# Altium footprint library Intelliclone.PcbLib: 372 footprints (part 4 of 24)
Each footprint in its own frame and in the unit in brackets; x right, y up, seen from the top. Pads: shape width x height; smd on the part's side, far side on the other; paste and mask are expansions set on the pad; w line width, h text height; cw(c..) or ccw(c..) is an arc to the next point about the centre after c.
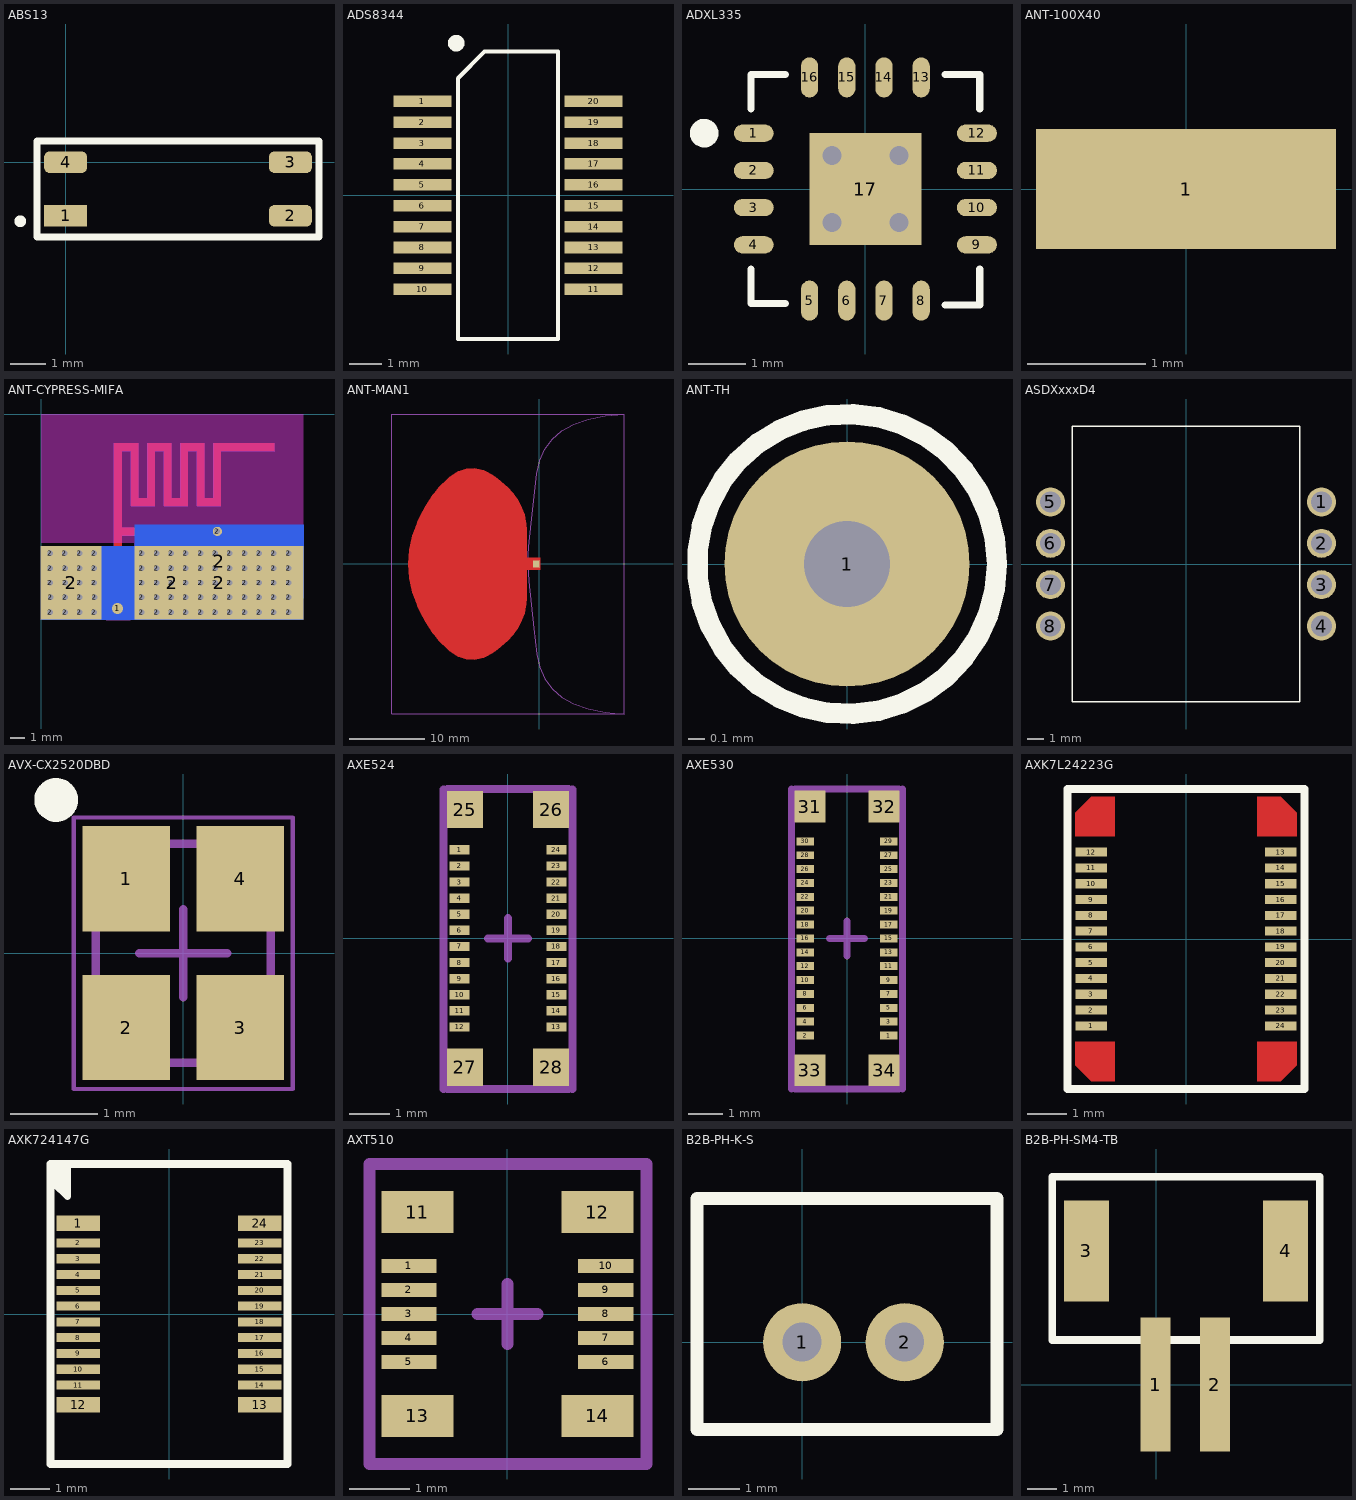
[diagram p3: the footprints below, top view; thin cyan lines are the x and y axes]

## ABS13 [mm]
pads (4):
  rect 1.2x0.6 smd: 1(0,-1.5)
  rrect50% 1.2x0.6 smd: 2(6.3,-1.5) 3(6.3,0) 4(0,0)
Top Overlay:
  circle w0.254: c-1.27,-1.651 r0.036
  lines w0.2: -0.8,-2.1 7.1,-2.1 7.1,0.6 -0.8,0.6 -0.8,-2.1
3D body: height 1.3, standoff 0.1, extent -0.356,-1.513 6.655,-0.113

## ADS8344 [mm]
height 2.54
pads (20):
  rect 1.75x0.35 smd: 1(-2.6,2.857) 2(-2.6,2.222) 3(-2.6,1.587) 4(-2.6,0.953) 5(-2.6,0.318) 6(-2.6,-0.318) 7(-2.6,-0.953) 8(-2.6,-1.587) 9(-2.6,-2.222) 10(-2.6,-2.857) 11(2.6,-2.857) 12(2.6,-2.222) 13(2.6,-1.587) 14(2.6,-0.953) 15(2.6,-0.318) 16(2.6,0.318) 17(2.6,0.953) 18(2.6,1.587) 19(2.6,2.222) 20(2.6,2.857)
Top Overlay:
  circle w0.254: c-1.575,4.623 r0.127
  lines w0.127: -1.524,-4.369 1.524,-4.369 1.524,4.369 -0.711,4.369 -1.524,3.556 -1.524,-4.369
3D body: height 1.73, standoff 0.1, extent -3.099,-4.369 3.099,4.369

## ADXL335 [mm]
height 1.35
pads (17):
  oval 0.7x0.3 smd: 1(-1.95,0.975) 2(-1.95,0.325) 3(-1.95,-0.325) 4(-1.95,-0.975) 9(1.95,-0.975) 10(1.95,-0.325) 11(1.95,0.325) 12(1.95,0.975)
  oval 0.3x0.7 smd: 5(-0.975,-1.95) 6(-0.325,-1.95) 7(0.325,-1.95) 8(0.975,-1.95) 13(0.975,1.95) 14(0.325,1.95) 15(-0.325,1.95) 16(-0.975,1.95)
  rect 1.956x1.956 smd: 17(0,0)
via -0.584,0.584 diameter 0.686 hole 0.33
via -0.584,-0.584 diameter 0.686 hole 0.33
via 0.584,-0.584 diameter 0.686 hole 0.33
via 0.584,0.584 diameter 0.686 hole 0.33
Top Overlay:
  circle w0.25: c-2.817,0.975 r0.125
  lines w0.127: -2,-1.397 -2,-2 -1.397,-2 ; -2,1.397 -2,2 -1.397,2 ; 1.397,-2.025 2,-2.025 2,-1.397 ; 1.397,2 2,2 2,1.397
3D body: height 1.42, standoff 0.1, extent -2.007,-2.007 2.007,2.007

## ANT-100X40 [mil] "Antenna solder pad 100mil x 40 mil"
pads (1):
  rect 100x40 smd: 1(0,0)

## ANT-CYPRESS-MIFA [mil] "FR4 2.5 GHz Narrowband Antenna"
pads (81):
  round 30 smd paste-10000 mask+4: 1(208.27,-529.92)
  round 25 hole 15: 2(25.5,-540) 2(25.5,-460) 2(25.5,-420) 2(25.5,-380) 2(25.67,-500) 2(64.96,-379.92) 2(65.5,-540) 2(65.5,-460) 2(65.5,-420) 2(65.67,-500) 2(105.5,-540) 2(105.5,-460) 2(105.5,-420) 2(105.5,-380) 2(105.67,-500) 2(145.5,-540) 2(145.5,-460) 2(145.5,-420) 2(145.5,-380) 2(145.67,-500) 2(274.5,-540) 2(274.5,-500) 2(274.5,-460) 2(274.5,-420) 2(274.5,-380) 2(314.5,-540) 2(314.5,-500) 2(314.5,-460) 2(314.5,-420) 2(314.5,-380) 2(354.5,-540) 2(354.5,-500) 2(354.5,-460) 2(354.5,-420) 2(354.5,-380) 2(394.5,-540) 2(394.5,-500) 2(394.5,-460) 2(394.5,-420) 2(394.5,-380) 2(434.5,-540) 2(434.5,-500) 2(434.5,-460) 2(434.5,-420) 2(434.5,-380) 2(474.5,-540) 2(474.5,-500) 2(474.5,-460) 2(474.5,-420) 2(474.5,-380) 2(480.31,-320) 2(514.5,-540) 2(514.5,-500) 2(514.5,-460) 2(514.5,-420) 2(514.5,-380) 2(554.5,-540) 2(554.5,-500) 2(554.5,-460) 2(554.5,-420) 2(554.5,-380) 2(594.5,-540) 2(594.5,-500) 2(594.5,-460) 2(594.5,-420) 2(594.5,-380) 2(634.5,-540) 2(634.5,-500) 2(634.5,-460) 2(634.5,-420) 2(634.5,-380) 2(674.5,-540) 2(674.5,-500) 2(674.5,-460) 2(674.5,-420) 2(674.5,-380)
  rect 165.51x200 smd paste-10000 mask+4: 2(81.72,-460)
  rect 715x200 smd far side paste-10000 mask+4: 2(357.5,-460)
  rect 460.63x200 smd far side paste-10000 mask+4: 2(485.04,-401.46)
  rect 460.28x200 smd paste-10000 mask+4: 2(485.07,-460)
Top Layer:
  region: 635,-100 490,-100 490,-250 425,-250 425,-100 400,-100 400,-250 335,-250 335,-100 310,-100 310,-250 245,-250 245,-100 220,-100 220,-310 462.62,-310 493,-310 493,-330 462.62,-330 220,-330 220,-360 242.5,-400 242.5,-547.26 177.5,-547.26 177.5,-400 200,-360 200,-80 265,-80 265,-230 290,-230 290,-80 355,-80 355,-230 380,-230 380,-80 445,-80 445,-230 470,-230 470,-80 635,-80
Bottom Layer:
  region: 253.31,-371.22 251.56,-380 253.31,-388.78 258.28,-396.22 263.93,-400 258.28,-403.78 253.31,-411.22 251.56,-420 253.31,-428.78 258.28,-436.22 263.93,-440 258.28,-443.78 253.31,-451.22 251.56,-460 253.31,-468.78 258.28,-476.22 263.93,-480 258.28,-483.78 253.31,-491.22 251.56,-500 253.31,-508.78 258.28,-516.22 263.93,-520 258.28,-523.78 253.31,-531.22 251.56,-540 253,-547.26 167,-547.26 168.44,-540 166.69,-531.22 161.72,-523.78 156.07,-520 161.72,-516.22 166.69,-508.78 168.44,-500 166.69,-491.22 161.72,-483.78 156.07,-480 161.72,-476.22 166.69,-468.78 168.44,-460 166.69,-451.22 161.72,-443.78 156.07,-440 161.72,-436.22 166.69,-428.78 168.44,-420 166.69,-411.22 161.72,-403.78 156.07,-400 161.72,-396.22 166.69,-388.78 168.44,-380 166.69,-371.22 166.35,-370.71 253.65,-370.71
Keep-Out Layer:
  region: 254.5,-300 715,-300 715,-364.17 254.5,-364.17
  region: 0,0 715,0 715,-350.39 0.23,-350.39
Mechanical 15:
  lines w1: 177.5,-560 177.5,-400 200,-360 200,-80 265,-80 265,-230 290,-230 290,-80 355,-80 355,-230 380,-230 380,-80 445,-80 445,-230 470,-230 470,-80 635,-80 635,-100 490,-100 490,-250 425,-250 425,-100 400,-100 400,-250 335,-250 335,-100 310,-100 310,-250 245,-250 245,-100 220,-100 220,-310 493,-310 493,-330 220,-330 220,-360 242.5,-400 242.5,-560 177.5,-560

## ANT-MAN1 [mm] "UWB MAN antenna"
pads (1):
  rect 0.9x0.92 smd paste-0.45: 1(-0.381,0)
Top Layer:
  region: 0.127,-0.813 -6.99,-0.813 -6.99,0.813 0.127,0.813
  region: -8.317,12.724 -9.687,12.724 -8.551,12.78
  region: -7.408,12.505 -10.324,12.505 -9.687,12.724 -8.317,12.724
  region: -7.087,12.336 -10.818,12.336 -10.324,12.505 -7.408,12.505
  region: -6.26,11.899 -11.5,11.899 -10.818,12.336 -7.087,12.336
  region: -5.876,11.617 -11.941,11.617 -11.5,11.899 -6.26,11.899
  region: -5.182,11.108 -12.483,11.108 -11.941,11.617 -5.876,11.617
  region: -4.577,10.569 -13.057,10.569 -12.483,11.108 -5.182,11.108
  region: -4.247,10.275 -13.293,10.275 -13.057,10.569 -4.577,10.569
  region: -3.456,9.4 -13.997,9.4 -13.293,10.275 -4.247,10.275
  region: -3.307,9.189 -14.166,9.189 -13.997,9.4 -3.456,9.4
  region: -2.808,8.483 -14.622,8.483 -14.166,9.189 -3.307,9.189
  region: -2.303,7.523 -15.241,7.523 -14.622,8.483 -2.808,8.483
  region: -2.288,7.48 -15.269,7.48 -15.241,7.523 -2.303,7.523
  region: -1.942,6.522 -15.76,6.522 -15.269,7.48 -2.288,7.48
  region: -1.751,5.606 -16.231,5.606 -15.76,6.522 -1.942,6.522
  region: -1.724,5.48 -16.277,5.48 -16.231,5.606 -1.751,5.606
  region: -1.65,4.396 -16.674,4.396 -16.277,5.48 -1.724,5.48
  region: -1.65,3.732 -16.918,3.732 -16.674,4.396 -1.65,4.396
  region: -1.65,1.857 -17.331,1.857 -16.918,3.732 -1.65,3.732
  region: -1.65,-0.018 -17.469,-0.018 -17.331,1.857 -1.65,1.857
  region: -1.65,-1.893 -17.331,-1.893 -17.469,-0.018 -1.65,-0.018
  region: -1.65,-3.768 -16.918,-3.768 -17.331,-1.893 -1.65,-1.893
  region: -1.65,-4.432 -16.674,-4.432 -16.918,-3.768 -1.65,-3.768
  region: -1.724,-5.516 -16.277,-5.516 -16.674,-4.432 -1.65,-4.432
  region: -1.751,-5.642 -16.231,-5.642 -16.277,-5.516 -1.724,-5.516
  region: -1.942,-6.558 -15.76,-6.558 -16.231,-5.642 -1.751,-5.642
  region: -2.288,-7.516 -15.269,-7.516 -15.76,-6.558 -1.942,-6.558
  region: -2.303,-7.559 -15.241,-7.559 -15.269,-7.516 -2.288,-7.516
  region: -2.808,-8.519 -14.622,-8.519 -15.241,-7.559 -2.303,-7.559
  region: -3.307,-9.225 -14.166,-9.225 -14.622,-8.519 -2.808,-8.519
  region: -3.456,-9.436 -13.997,-9.436 -14.166,-9.225 -3.307,-9.225
  region: -4.247,-10.311 -13.293,-10.311 -13.997,-9.436 -3.456,-9.436
  region: -4.577,-10.605 -13.057,-10.605 -13.293,-10.311 -4.247,-10.311
  region: -5.182,-11.144 -12.483,-11.144 -13.057,-10.605 -4.577,-10.605
  region: -5.876,-11.653 -11.941,-11.653 -12.483,-11.144 -5.182,-11.144
  region: -6.26,-11.935 -11.5,-11.935 -11.941,-11.653 -5.876,-11.653
  region: -7.087,-12.372 -10.818,-12.372 -11.5,-11.935 -6.26,-11.935
  region: -7.408,-12.541 -10.324,-12.541 -10.818,-12.372 -7.087,-12.372
  region: -8.317,-12.76 -9.687,-12.76 -10.324,-12.541 -7.408,-12.541
  region: -8.551,-12.816 -9.687,-12.76 -8.317,-12.76
Mechanical 15:
  lines w0.1: -1.528,-0.018 -1.388,-2.31 -0.686,-8.585 -0.296,-12.054 0.065,-13.81 0.738,-15.35 1.725,-16.674 3.024,-17.78 4.636,-18.669 6.56,-19.339 8.796,-19.794 11.359,-20.032 11.359,19.996 8.796,19.758 6.56,19.303 4.636,18.633 3.024,17.744 1.725,16.638 0.738,15.314 0.065,13.774 -0.296,12.018 -1.022,5.448 -1.388,2.274 -1.528,-0.018
  lines w0.152: -19.654,-20.018 11.346,-20.018 11.346,19.982 -19.654,19.982 -19.654,-20.018

## ANT-TH [mil] "Through hole antenna for .010\" wire and ferrule"
pads (1):
  round 60 hole 21: 1(0,0)
Top Overlay:
  circle w5: c0,0 r36.69

## ASDXxxxD4 [mil]
pads (8):
  round 70 hole 50: 1(327.5,150) 2(327.5,50) 3(327.5,-50) 4(327.5,-150) 5(-327.5,150) 6(-327.5,50) 7(-327.5,-50) 8(-327.5,-150)
Top Overlay:
  lines w4.02: -275,-332.5 275,-332.5 275,332.5 -275,332.5 -275,-332.5
3D body: height 294.65, standoff 205, extent -216.82,-644 -127,-144
3D body: height 139.45, standoff 0, extent -69.86,-644 69.86,-334
3D body: height 250, standoff 1, extent -275,-332 275,332

## AVX-CX2520DBD [mm] "Hand Drawn, 4-Leads,Body 2.5x2mm"
height 0.55
pads (4):
  rect 1x1.2 smd: 1(-0.65,0.85) 2(-0.65,-0.85) 3(0.65,-0.85) 4(0.65,0.85)
Top Overlay:
  circle w0.25: c-1.45,1.75 r0.125
Mechanical 13:
  lines w0.1: -1,-1.25 1,-1.25 1,1.25 -1,1.25 -1,-1.25
Mechanical 15:
  lines w0.05: -1.25,-1.55 1.25,-1.55 1.25,1.55 -1.25,1.55 -1.25,-1.55
  lines w0.1: -0.5,0 0.5,0 ; 0,-0.5 0,0.5
3D body: height 0.55, standoff 0, extent -1,-1.25 1,1.25

## AXE524 [mm] "Panasonic A4S series, 24pin"
pads (28):
  rect 0.5x0.23 smd mask-0.03: 1(-1.2,2.2) 2(-1.2,1.8) 3(-1.2,1.4) 4(-1.2,1) 5(-1.2,0.6) 6(-1.2,0.2) 7(-1.2,-0.2) 8(-1.2,-0.6) 9(-1.2,-1) 10(-1.2,-1.4) 11(-1.2,-1.8) 12(-1.2,-2.2) 13(1.2,-2.2) 14(1.2,-1.8) 15(1.2,-1.4) 16(1.2,-1) 17(1.2,-0.6) 18(1.2,-0.2) 19(1.2,0.2) 20(1.2,0.6) 21(1.2,1) 22(1.2,1.4) 23(1.2,1.8) 24(1.2,2.2)
  rect 0.9x0.92 smd paste-0.35: 25(-1.07,3.2) 26(1.07,3.2) 27(-1.07,-3.2) 28(1.07,-3.2)
Mechanical 16:
  lines w0.2: -1.6,-3.74 -1.6,3.7 ; -1.5,-3.74 1.5,-3.74 ; -1.5,3.71 1.5,3.71 ; -0.5,0 0,0 ; 0,-0.5 0,0 ; 0,0.5 0,0 ; 0.5,0 0,0 ; 1.6,-3.74 1.6,3.7
3D body "axe524124.stp": height 0.77, standoff 0, extent -1.25,-3.65 1.25,3.65

## AXE530 [mm] "Panasonic A4S series, 30 pin"
pads (34):
  rect 0.5x0.23 smd mask-0.03: 1(1.2,-2.8) 2(-1.2,-2.8) 3(1.2,-2.4) 4(-1.2,-2.4) 5(1.2,-2) 6(-1.2,-2) 7(1.2,-1.6) 8(-1.2,-1.6) 9(1.2,-1.2) 10(-1.2,-1.2) 11(1.2,-0.8) 12(-1.2,-0.8) 13(1.2,-0.4) 14(-1.2,-0.4) 15(1.2,0) 16(-1.2,0) 17(1.2,0.4) 18(-1.2,0.4) 19(1.2,0.8) 20(-1.2,0.8) 21(1.2,1.2) 22(-1.2,1.2) 23(1.2,1.6) 24(-1.2,1.6) 25(1.2,2) 26(-1.2,2) 27(1.2,2.4) 28(-1.2,2.4) 29(1.2,2.8) 30(-1.2,2.8)
  rect 0.9x0.92 smd paste-0.35: 31(-1.07,3.8) 32(1.07,3.8) 33(-1.07,-3.8) 34(1.07,-3.8)
Mechanical 16:
  lines w0.2: -1.6,-4.34 -1.6,4.31 ; -1.5,-4.34 1.5,-4.34 ; -1.5,4.31 1.5,4.31 ; -0.5,0 0,0 ; 0,-0.5 0,0 ; 0,0.5 0,0 ; 0.5,0 0,0 ; 1.6,-4.34 1.6,4.31
3D body "axe530127.step": height 0.77, standoff 0, extent -1.225,-4.25 1.275,4.25

## AXK7L24223G [mm] "Panasonic F4 Family Connector Socket 24 pins"
pads (24):
  rect 0.8x0.23 smd: 1(-2.4,-2.2) 2(-2.4,-1.8) 3(-2.4,-1.4) 4(-2.4,-1) 5(-2.4,-0.6) 6(-2.4,-0.2) 7(-2.4,0.2) 8(-2.4,0.6) 9(-2.4,1) 10(-2.4,1.4) 11(-2.4,1.8) 12(-2.4,2.2) 13(2.4,2.2) 14(2.4,1.8) 15(2.4,1.4) 16(2.4,1) 17(2.4,0.6) 18(2.4,0.2) 19(2.4,-0.2) 20(2.4,-0.6) 21(2.4,-1) 22(2.4,-1.4) 23(2.4,-1.8) 24(2.4,-2.2)
Top Layer:
  region: -1.8,3.6 -1.8,2.6 -2.8,2.6 -2.8,3.2 -2.4,3.6
  region: 2.8,2.6 1.8,2.6 1.8,3.6 2.4,3.6 2.8,3.2
  region: 1.8,-3.6 1.8,-2.6 2.8,-2.6 2.8,-3.2 2.4,-3.6
  region: -2.8,-2.6 -1.8,-2.6 -1.8,-3.6 -2.4,-3.6 -2.8,-3.2
Top Overlay:
  lines w0.2: -3,-3.8 -3,3.8 -0.5,3.8 3,3.8 3,-3.8 -3,-3.8
3D body "axk7l24223.step": height 0.87, standoff 0, extent -2.5,-3.6 2.5,3.6

## AXK724147G [mm] "Panasonic P4 Family Connector Socket 24 pins"
height 1.31
pads (24):
  rect 1.1x0.4 smd: 1(-2.3,2.3) 12(-2.3,-2.3) 13(2.3,-2.3) 24(2.3,2.3)
  rect 1.1x0.23 smd: 2(-2.3,1.8) 3(-2.3,1.4) 4(-2.3,1) 5(-2.3,0.6) 6(-2.3,0.2) 7(-2.3,-0.2) 8(-2.3,-0.6) 9(-2.3,-1) 10(-2.3,-1.4) 11(-2.3,-1.8) 14(2.3,-1.8) 15(2.3,-1.4) 16(2.3,-1) 17(2.3,-0.6) 18(2.3,-0.2) 19(2.3,0.2) 20(2.3,0.6) 21(2.3,1) 22(2.3,1.4) 23(2.3,1.8)
Top Overlay:
  lines w0.076: -3,3.8 -2.57,3.8 ; -2.95,2.6 -2.95,2.63
  lines w0.178: -2.881,3.753 -2.881,3.286 -2.57,2.975 -2.57,3.8 ; -2.741,3.184 -2.741,3.784
  lines w0.2: -3,-3.8 3,-3.8 3,3.8 -0.5,3.8 -3,3.8 -3,-3.8
3D body "axk724147.stp": height 1.5, standoff 0, extent -2.55,-3.55 2.55,3.55

## AXT510 [mm] "Panasonic F4S series, 10pin"
pads (14):
  rect 0.92x0.23 smd mask-0.03: 1(-1.64,0.8) 2(-1.64,0.4) 3(-1.64,0) 4(-1.64,-0.4) 5(-1.64,-0.8) 6(1.64,-0.8) 7(1.64,-0.4) 8(1.64,0) 9(1.64,0.4) 10(1.64,0.8)
  rect 1.2x0.7 smd paste-0.35: 11(-1.5,1.7) 12(1.5,1.7) 13(-1.5,-1.7) 14(1.5,-1.7)
Mechanical 16:
  lines w0.2: -0.5,0 0,0 ; 0,-0.5 0,0 ; 0,0.5 0,0 ; 0.5,0 0,0 ; -2.3,-2.5 -2.3,2.5 2.325,2.5 2.325,-2.5 -2.3,-2.5
3D body "axt510124.stp": height 0.97, standoff 0, extent -1.8,-2.25 1.8,2.25

## B2B-PH-K-S [mil] "CONN HEADER PH TOP 2POS 2MM"
height 236.22
pads (2):
  round 60 hole 30: 1(0,0) 2(78.74,0)
Top Overlay:
  lines w10: -80.71,-66.93 149.61,-66.93 149.61,110.24 -80.71,110.24 -80.71,-66.93
3D body "B2B-PH-K-S.STEP": height 236.22, standoff -133.86, extent -76.77,-66.93 155.51,110.24

## B2B-PH-SM4-TB [mm] "CONN HEADER PH TOP 2POS 2MM SMD"
height 6
pads (4):
  rect 1x4.5 smd: 1(-0.025,0) 2(1.975,0)
  rect 1.5x3.4 smd: 3(-2.35,4.5) 4(4.35,4.5)
Top Overlay:
  lines w0.254: -3.5,1.5 -3.5,7 5.5,7 5.5,1.5 -3.5,1.5
3D body "B2B-PH-SM4-TB.STEP": height 6.6, standoff 0, extent -2.975,0 4.975,7